# Altium footprint library ICL_komponenty_v1.PcbLib: 160 footprints (part 5 of 10)
Each footprint in its own frame and in the unit in brackets; x right, y up, seen from the top. Pads: shape width x height; smd on the part's side, far side on the other; paste and mask are expansions set on the pad; w line width, h text height; cw(c..) or ccw(c..) is an arc to the next point about the centre after c.
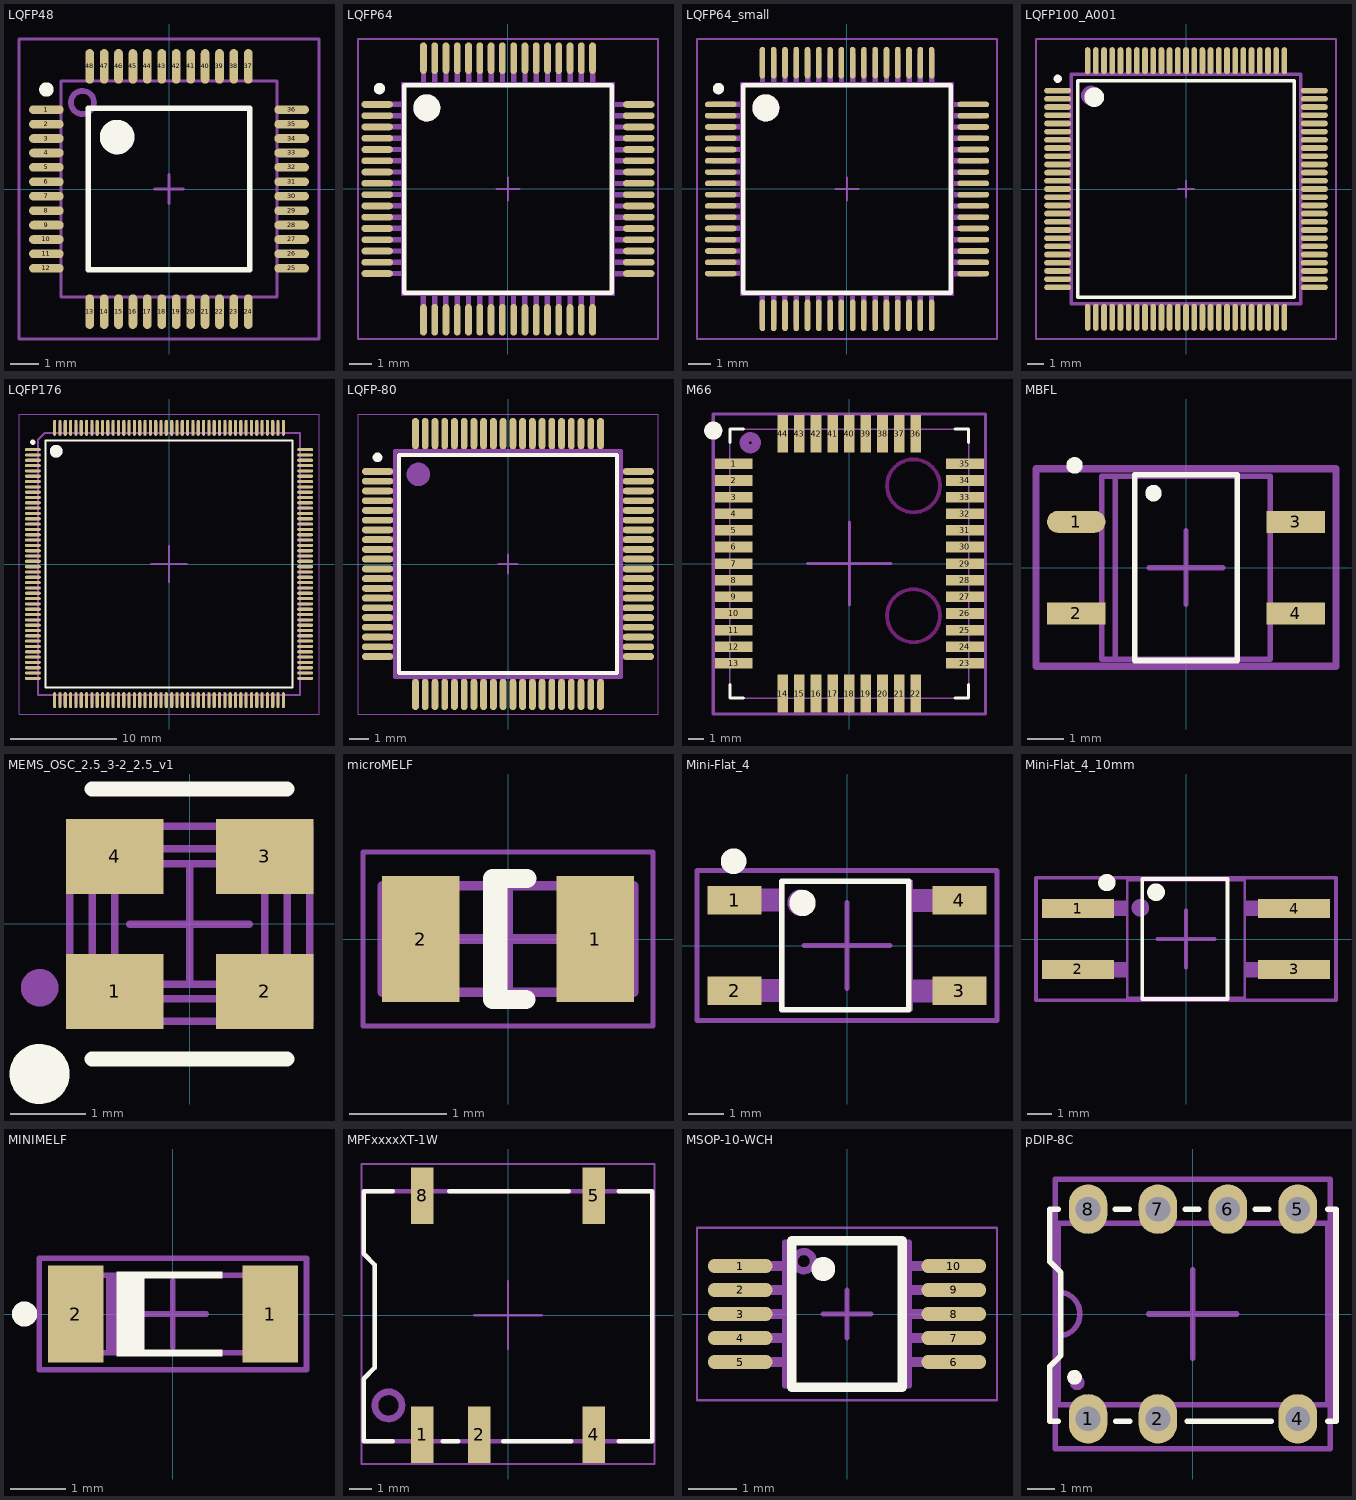
[diagram p4: the footprints below, top view; thin cyan lines are the x and y axes]

## LQFP48 [mm]
height 1.6
pads (48):
  oval 1.2x0.3 smd: 1(-4.25,2.75) 2(-4.25,2.25) 3(-4.25,1.75) 4(-4.25,1.25) 5(-4.25,0.75) 6(-4.25,0.25) 7(-4.25,-0.25) 8(-4.25,-0.75) 9(-4.25,-1.25) 10(-4.25,-1.75) 11(-4.25,-2.25) 12(-4.25,-2.75) 25(4.25,-2.75) 26(4.25,-2.25) 27(4.25,-1.75) 28(4.25,-1.25) 29(4.25,-0.75) 30(4.25,-0.25) 31(4.25,0.25) 32(4.25,0.75) 33(4.25,1.25) 34(4.25,1.75) 35(4.25,2.25) 36(4.25,2.75)
  oval 0.3x1.2 smd: 13(-2.75,-4.25) 14(-2.25,-4.25) 15(-1.75,-4.25) 16(-1.25,-4.25) 17(-0.75,-4.25) 18(-0.25,-4.25) 19(0.25,-4.25) 20(0.75,-4.25) 21(1.25,-4.25) 22(1.75,-4.25) 23(2.25,-4.25) 24(2.75,-4.25) 37(2.75,4.25) 38(2.25,4.25) 39(1.75,4.25) 40(1.25,4.25) 41(0.75,4.25) 42(0.25,4.25) 43(-0.25,4.25) 44(-0.75,4.25) 45(-1.25,4.25) 46(-1.75,4.25) 47(-2.25,4.25) 48(-2.75,4.25)
Top Overlay:
  circle w0.25: c-4.25,3.45 r0.125
  circle w0.6: c-1.8,1.8 r0.3
  lines w0.2: -2.8,-2.8 -2.8,2.8 2.8,2.8 2.8,-2.8 -2.8,-2.8
Top M11-12_SMOT:
  circle w0.2: c-3,3 r0.4
  rectangle: -2.85,3.75 -2.65,4.6
  rectangle: -2.35,3.75 -2.15,4.6
  rectangle: -1.85,3.75 -1.65,4.6
  rectangle: -1.35,3.75 -1.15,4.6
  rectangle: -0.85,3.75 -0.65,4.6
  rectangle: -0.35,3.75 -0.15,4.6
  rectangle: 0.15,3.75 0.35,4.6
  rectangle: 0.65,3.75 0.85,4.6
  rectangle: 1.15,3.75 1.35,4.6
  rectangle: 1.65,3.75 1.85,4.6
  rectangle: 2.15,3.75 2.35,4.6
  rectangle: 2.65,3.75 2.85,4.6
  region: 3.75,2.85 3.75,2.65 4.6,2.65 4.6,2.85
  region: 3.75,2.35 3.75,2.15 4.6,2.15 4.6,2.35
  region: 3.75,1.85 3.75,1.65 4.6,1.65 4.6,1.85
  region: 3.75,1.35 3.75,1.15 4.6,1.15 4.6,1.35
  region: 3.75,0.85 3.75,0.65 4.6,0.65 4.6,0.85
  region: 3.75,0.35 3.75,0.15 4.6,0.15 4.6,0.35
  region: 3.75,-0.15 3.75,-0.35 4.6,-0.35 4.6,-0.15
  region: 3.75,-0.65 3.75,-0.85 4.6,-0.85 4.6,-0.65
  region: 3.75,-1.15 3.75,-1.35 4.6,-1.35 4.6,-1.15
  region: 3.75,-1.65 3.75,-1.85 4.6,-1.85 4.6,-1.65
  region: 3.75,-2.15 3.75,-2.35 4.6,-2.35 4.6,-2.15
  region: 3.75,-2.65 3.75,-2.85 4.6,-2.85 4.6,-2.65
  region: 2.85,-3.75 2.65,-3.75 2.65,-4.6 2.85,-4.6
  region: 2.35,-3.75 2.15,-3.75 2.15,-4.6 2.35,-4.6
  region: 1.85,-3.75 1.65,-3.75 1.65,-4.6 1.85,-4.6
  region: 1.35,-3.75 1.15,-3.75 1.15,-4.6 1.35,-4.6
  region: 0.85,-3.75 0.65,-3.75 0.65,-4.6 0.85,-4.6
  region: 0.35,-3.75 0.15,-3.75 0.15,-4.6 0.35,-4.6
  region: -0.15,-3.75 -0.35,-3.75 -0.35,-4.6 -0.15,-4.6
  region: -0.65,-3.75 -0.85,-3.75 -0.85,-4.6 -0.65,-4.6
  region: -1.15,-3.75 -1.35,-3.75 -1.35,-4.6 -1.15,-4.6
  region: -1.65,-3.75 -1.85,-3.75 -1.85,-4.6 -1.65,-4.6
  region: -2.15,-3.75 -2.35,-3.75 -2.35,-4.6 -2.15,-4.6
  region: -2.65,-3.75 -2.85,-3.75 -2.85,-4.6 -2.65,-4.6
  region: -3.75,-2.85 -3.75,-2.65 -4.6,-2.65 -4.6,-2.85
  region: -3.75,-2.35 -3.75,-2.15 -4.6,-2.15 -4.6,-2.35
  region: -3.75,-1.85 -3.75,-1.65 -4.6,-1.65 -4.6,-1.85
  region: -3.75,-1.35 -3.75,-1.15 -4.6,-1.15 -4.6,-1.35
  region: -3.75,-0.85 -3.75,-0.65 -4.6,-0.65 -4.6,-0.85
  region: -3.75,-0.35 -3.75,-0.15 -4.6,-0.15 -4.6,-0.35
  region: -3.75,0.15 -3.75,0.35 -4.6,0.35 -4.6,0.15
  region: -3.75,0.65 -3.75,0.85 -4.6,0.85 -4.6,0.65
  region: -3.75,1.15 -3.75,1.35 -4.6,1.35 -4.6,1.15
  region: -3.75,1.65 -3.75,1.85 -4.6,1.85 -4.6,1.65
  region: -3.75,2.15 -3.75,2.35 -4.6,2.35 -4.6,2.15
  region: -3.75,2.65 -3.75,2.85 -4.6,2.85 -4.6,2.65
  lines w0.1: -3.75,-3.75 -3.75,3.75 3.75,3.75 3.75,-3.75 -3.75,-3.75
Top M13-14_SDES:
  text "'.Designator'" at -6.798,-0.5 h1.2
Top M15-16_SORG:
  lines w0.1: -0.5,0 0.5,0 ; 0,-0.5 0,0.5 ; -5.2,-5.2 -5.2,5.2 5.2,5.2 5.2,-5.2 -5.2,-5.2
3D body "LQFP-48.stp": height 1.56, standoff 0, extent -4.5,-4.529 4.5,4.47

## LQFP64 [mm] "TSQFP, 64-Leads, Body 10,00x10,00mm, Pitch 0,50mm"
height 1.6
pads (64):
  oval 1.4x0.3 smd: 1(-5.8,3.75) 2(-5.8,3.25) 3(-5.8,2.75) 4(-5.8,2.25) 5(-5.8,1.75) 6(-5.8,1.25) 7(-5.8,0.75) 8(-5.8,0.25) 9(-5.8,-0.25) 10(-5.8,-0.75) 11(-5.8,-1.25) 12(-5.8,-1.75) 13(-5.8,-2.25) 14(-5.8,-2.75) 15(-5.8,-3.25) 16(-5.8,-3.75) 33(5.8,-3.75) 34(5.8,-3.25) 35(5.8,-2.75) 36(5.8,-2.25) 37(5.8,-1.75) 38(5.8,-1.25) 39(5.8,-0.75) 40(5.8,-0.25) 41(5.8,0.25) 42(5.8,0.75) 43(5.8,1.25) 44(5.8,1.75) 45(5.8,2.25) 46(5.8,2.75) 47(5.8,3.25) 48(5.8,3.75)
  oval 0.3x1.4 smd: 17(-3.75,-5.8) 18(-3.25,-5.8) 19(-2.75,-5.8) 20(-2.25,-5.8) 21(-1.75,-5.8) 22(-1.25,-5.8) 23(-0.75,-5.8) 24(-0.25,-5.8) 25(0.25,-5.8) 26(0.75,-5.8) 27(1.25,-5.8) 28(1.75,-5.8) 29(2.25,-5.8) 30(2.75,-5.8) 31(3.25,-5.8) 32(3.75,-5.8) 49(3.75,5.8) 50(3.25,5.8) 51(2.75,5.8) 52(2.25,5.8) 53(1.75,5.8) 54(1.25,5.8) 55(0.75,5.8) 56(0.25,5.8) 57(-0.25,5.8) 58(-0.75,5.8) 59(-1.25,5.8) 60(-1.75,5.8) 61(-2.25,5.8) 62(-2.75,5.8) 63(-3.25,5.8) 64(-3.75,5.8)
Top Overlay:
  circle w0.25: c-5.7,4.45 r0.125
  circle w0.6: c-3.6,3.6 r0.3
  lines w0.2: -4.6,-4.6 -4.6,4.6 4.6,4.6 4.6,-4.6 -4.6,-4.6
Top M11-12_SMOT:
  circle w0.25: c-5.7,4.45 r0.125
  circle w0.6: c-3.6,3.6 r0.3
  region: -4.707,-2.366 -4.707,-2.128 -6.006,-2.128 -6.006,-2.366
  region: -4.707,-2.866 -4.707,-2.628 -6.006,-2.628 -6.006,-2.866
  region: -4.707,-3.366 -4.707,-3.128 -6.006,-3.128 -6.006,-3.366
  region: -4.707,-3.866 -4.707,-3.628 -6.006,-3.628 -6.006,-3.866
  region: -4.707,-0.366 -4.707,-0.128 -6.006,-0.128 -6.006,-0.366
  region: -4.707,-0.866 -4.707,-0.628 -6.006,-0.628 -6.006,-0.866
  region: -4.707,-1.366 -4.707,-1.128 -6.006,-1.128 -6.006,-1.366
  region: -4.707,-1.866 -4.707,-1.628 -6.006,-1.628 -6.006,-1.866
  region: -4.707,1.634 -4.707,1.872 -6.006,1.872 -6.006,1.634
  region: -4.707,1.134 -4.707,1.372 -6.006,1.372 -6.006,1.134
  region: -4.707,0.634 -4.707,0.872 -6.006,0.872 -6.006,0.634
  region: -4.707,0.134 -4.707,0.372 -6.006,0.372 -6.006,0.134
  region: -4.707,3.634 -4.707,3.872 -6.006,3.872 -6.006,3.634
  region: -4.707,3.134 -4.707,3.372 -6.006,3.372 -6.006,3.134
  region: -4.707,2.634 -4.707,2.872 -6.006,2.872 -6.006,2.634
  region: -4.707,2.134 -4.707,2.372 -6.006,2.372 -6.006,2.134
  region: -3.634,-4.707 -3.872,-4.707 -3.872,-6.006 -3.634,-6.006
  region: -3.134,-4.707 -3.372,-4.707 -3.372,-6.006 -3.134,-6.006
  region: -2.634,-4.707 -2.872,-4.707 -2.872,-6.006 -2.634,-6.006
  region: -2.134,-4.707 -2.372,-4.707 -2.372,-6.006 -2.134,-6.006
  rectangle: -2.366,4.707 -2.128,6.006
  rectangle: -2.866,4.707 -2.628,6.006
  rectangle: -3.366,4.707 -3.128,6.006
  rectangle: -3.866,4.707 -3.628,6.006
  region: -1.634,-4.707 -1.872,-4.707 -1.872,-6.006 -1.634,-6.006
  region: -1.134,-4.707 -1.372,-4.707 -1.372,-6.006 -1.134,-6.006
  region: -0.634,-4.707 -0.872,-4.707 -0.872,-6.006 -0.634,-6.006
  region: -0.134,-4.707 -0.372,-4.707 -0.372,-6.006 -0.134,-6.006
  rectangle: -0.366,4.707 -0.128,6.006
  rectangle: -0.866,4.707 -0.628,6.006
  rectangle: -1.366,4.707 -1.128,6.006
  rectangle: -1.866,4.707 -1.628,6.006
  region: 0.366,-4.707 0.128,-4.707 0.128,-6.006 0.366,-6.006
  region: 0.866,-4.707 0.628,-4.707 0.628,-6.006 0.866,-6.006
  region: 1.366,-4.707 1.128,-4.707 1.128,-6.006 1.366,-6.006
  region: 1.866,-4.707 1.628,-4.707 1.628,-6.006 1.866,-6.006
  rectangle: 1.634,4.707 1.872,6.006
  rectangle: 1.134,4.707 1.372,6.006
  rectangle: 0.634,4.707 0.872,6.006
  rectangle: 0.134,4.707 0.372,6.006
  region: 2.366,-4.707 2.128,-4.707 2.128,-6.006 2.366,-6.006
  region: 2.866,-4.707 2.628,-4.707 2.628,-6.006 2.866,-6.006
  region: 3.366,-4.707 3.128,-4.707 3.128,-6.006 3.366,-6.006
  region: 3.866,-4.707 3.628,-4.707 3.628,-6.006 3.866,-6.006
  rectangle: 3.634,4.707 3.872,6.006
  rectangle: 3.134,4.707 3.372,6.006
  rectangle: 2.634,4.707 2.872,6.006
  rectangle: 2.134,4.707 2.372,6.006
  region: 4.707,-3.634 4.707,-3.872 6.006,-3.872 6.006,-3.634
  region: 4.707,-3.134 4.707,-3.372 6.006,-3.372 6.006,-3.134
  region: 4.707,-2.634 4.707,-2.872 6.006,-2.872 6.006,-2.634
  region: 4.707,-2.134 4.707,-2.372 6.006,-2.372 6.006,-2.134
  region: 4.707,-1.634 4.707,-1.872 6.006,-1.872 6.006,-1.634
  region: 4.707,-1.134 4.707,-1.372 6.006,-1.372 6.006,-1.134
  region: 4.707,-0.634 4.707,-0.872 6.006,-0.872 6.006,-0.634
  region: 4.707,-0.134 4.707,-0.372 6.006,-0.372 6.006,-0.134
  region: 4.707,0.366 4.707,0.128 6.006,0.128 6.006,0.366
  region: 4.707,0.866 4.707,0.628 6.006,0.628 6.006,0.866
  region: 4.707,1.366 4.707,1.128 6.006,1.128 6.006,1.366
  region: 4.707,1.866 4.707,1.628 6.006,1.628 6.006,1.866
  region: 4.707,2.366 4.707,2.128 6.006,2.128 6.006,2.366
  region: 4.707,2.866 4.707,2.628 6.006,2.628 6.006,2.866
  region: 4.707,3.366 4.707,3.128 6.006,3.128 6.006,3.366
  region: 4.707,3.866 4.707,3.628 6.006,3.628 6.006,3.866
  lines w0.1: -4.7,-4.7 -4.7,4.7 4.7,4.7 4.7,-4.7 -4.7,-4.7
Top M13-14_SDES:
  text "'.Designator'" at -6.798,-0.5 h1.2
Top M15-16_SORG:
  lines w0.1: -0.5,0 0.5,0 ; 0,-0.5 0,0.5 ; -6.65,-6.65 -6.65,6.65 6.65,6.65 6.65,-6.65 -6.65,-6.65
3D body "LQFP64.step": height 1.6, standoff 0, extent -6,-6 6,6

## LQFP64_small [mm] "TSQFP, 64-Leads, Body 10,00x10,00mm, Pitch 0,50mm"
height 1.6
pads (64):
  oval 1.4x0.25 smd: 1(-5.6,3.75) 2(-5.6,3.25) 3(-5.6,2.75) 4(-5.6,2.25) 5(-5.6,1.75) 6(-5.6,1.25) 7(-5.6,0.75) 8(-5.6,0.25) 9(-5.6,-0.25) 10(-5.6,-0.75) 11(-5.6,-1.25) 12(-5.6,-1.75) 13(-5.6,-2.25) 14(-5.6,-2.75) 15(-5.6,-3.25) 16(-5.6,-3.75) 33(5.6,-3.75) 34(5.6,-3.25) 35(5.6,-2.75) 36(5.6,-2.25) 37(5.6,-1.75) 38(5.6,-1.25) 39(5.6,-0.75) 40(5.6,-0.25) 41(5.6,0.25) 42(5.6,0.75) 43(5.6,1.25) 44(5.6,1.75) 45(5.6,2.25) 46(5.6,2.75) 47(5.6,3.25) 48(5.6,3.75)
  oval 0.25x1.4 smd: 17(-3.75,-5.6) 18(-3.25,-5.6) 19(-2.75,-5.6) 20(-2.25,-5.6) 21(-1.75,-5.6) 22(-1.25,-5.6) 23(-0.75,-5.6) 24(-0.25,-5.6) 25(0.25,-5.6) 26(0.75,-5.6) 27(1.25,-5.6) 28(1.75,-5.6) 29(2.25,-5.6) 30(2.75,-5.6) 31(3.25,-5.6) 32(3.75,-5.6) 49(3.75,5.6) 50(3.25,5.6) 51(2.75,5.6) 52(2.25,5.6) 53(1.75,5.6) 54(1.25,5.6) 55(0.75,5.6) 56(0.25,5.6) 57(-0.25,5.6) 58(-0.75,5.6) 59(-1.25,5.6) 60(-1.75,5.6) 61(-2.25,5.6) 62(-2.75,5.6) 63(-3.25,5.6) 64(-3.75,5.6)
Top Overlay:
  circle w0.6: c-3.6,3.6 r0.3
  circle w0.25: c-5.7,4.45 r0.125
  lines w0.2: -4.6,-4.6 4.6,-4.6 4.6,4.6 -4.6,4.6 -4.6,-4.6
Top M11-12_SMOT:
  circle w0.6: c-3.6,3.6 r0.3
  circle w0.25: c-5.7,4.45 r0.125
  region: 4.707,3.866 4.707,3.628 6.006,3.628 6.006,3.866
  region: 4.707,3.366 4.707,3.128 6.006,3.128 6.006,3.366
  region: 4.707,2.866 4.707,2.628 6.006,2.628 6.006,2.866
  region: 4.707,2.366 4.707,2.128 6.006,2.128 6.006,2.366
  region: 4.707,1.866 4.707,1.628 6.006,1.628 6.006,1.866
  region: 4.707,1.366 4.707,1.128 6.006,1.128 6.006,1.366
  region: 4.707,0.866 4.707,0.628 6.006,0.628 6.006,0.866
  region: 4.707,0.366 4.707,0.128 6.006,0.128 6.006,0.366
  region: 4.707,-0.134 4.707,-0.372 6.006,-0.372 6.006,-0.134
  region: 4.707,-0.634 4.707,-0.872 6.006,-0.872 6.006,-0.634
  region: 4.707,-1.134 4.707,-1.372 6.006,-1.372 6.006,-1.134
  region: 4.707,-1.634 4.707,-1.872 6.006,-1.872 6.006,-1.634
  region: 4.707,-2.134 4.707,-2.372 6.006,-2.372 6.006,-2.134
  region: 4.707,-2.634 4.707,-2.872 6.006,-2.872 6.006,-2.634
  region: 4.707,-3.134 4.707,-3.372 6.006,-3.372 6.006,-3.134
  region: 4.707,-3.634 4.707,-3.872 6.006,-3.872 6.006,-3.634
  rectangle: 2.134,4.707 2.372,6.006
  rectangle: 2.634,4.707 2.872,6.006
  rectangle: 3.134,4.707 3.372,6.006
  rectangle: 3.634,4.707 3.872,6.006
  region: 3.866,-4.707 3.628,-4.707 3.628,-6.006 3.866,-6.006
  region: 3.366,-4.707 3.128,-4.707 3.128,-6.006 3.366,-6.006
  region: 2.866,-4.707 2.628,-4.707 2.628,-6.006 2.866,-6.006
  region: 2.366,-4.707 2.128,-4.707 2.128,-6.006 2.366,-6.006
  rectangle: 0.134,4.707 0.372,6.006
  rectangle: 0.634,4.707 0.872,6.006
  rectangle: 1.134,4.707 1.372,6.006
  rectangle: 1.634,4.707 1.872,6.006
  region: 1.866,-4.707 1.628,-4.707 1.628,-6.006 1.866,-6.006
  region: 1.366,-4.707 1.128,-4.707 1.128,-6.006 1.366,-6.006
  region: 0.866,-4.707 0.628,-4.707 0.628,-6.006 0.866,-6.006
  region: 0.366,-4.707 0.128,-4.707 0.128,-6.006 0.366,-6.006
  rectangle: -1.866,4.707 -1.628,6.006
  rectangle: -1.366,4.707 -1.128,6.006
  rectangle: -0.866,4.707 -0.628,6.006
  rectangle: -0.366,4.707 -0.128,6.006
  region: -0.134,-4.707 -0.372,-4.707 -0.372,-6.006 -0.134,-6.006
  region: -0.634,-4.707 -0.872,-4.707 -0.872,-6.006 -0.634,-6.006
  region: -1.134,-4.707 -1.372,-4.707 -1.372,-6.006 -1.134,-6.006
  region: -1.634,-4.707 -1.872,-4.707 -1.872,-6.006 -1.634,-6.006
  rectangle: -3.866,4.707 -3.628,6.006
  rectangle: -3.366,4.707 -3.128,6.006
  rectangle: -2.866,4.707 -2.628,6.006
  rectangle: -2.366,4.707 -2.128,6.006
  region: -2.134,-4.707 -2.372,-4.707 -2.372,-6.006 -2.134,-6.006
  region: -2.634,-4.707 -2.872,-4.707 -2.872,-6.006 -2.634,-6.006
  region: -3.134,-4.707 -3.372,-4.707 -3.372,-6.006 -3.134,-6.006
  region: -3.634,-4.707 -3.872,-4.707 -3.872,-6.006 -3.634,-6.006
  region: -4.707,2.134 -4.707,2.372 -6.006,2.372 -6.006,2.134
  region: -4.707,2.634 -4.707,2.872 -6.006,2.872 -6.006,2.634
  region: -4.707,3.134 -4.707,3.372 -6.006,3.372 -6.006,3.134
  region: -4.707,3.634 -4.707,3.872 -6.006,3.872 -6.006,3.634
  region: -4.707,0.134 -4.707,0.372 -6.006,0.372 -6.006,0.134
  region: -4.707,0.634 -4.707,0.872 -6.006,0.872 -6.006,0.634
  region: -4.707,1.134 -4.707,1.372 -6.006,1.372 -6.006,1.134
  region: -4.707,1.634 -4.707,1.872 -6.006,1.872 -6.006,1.634
  region: -4.707,-1.866 -4.707,-1.628 -6.006,-1.628 -6.006,-1.866
  region: -4.707,-1.366 -4.707,-1.128 -6.006,-1.128 -6.006,-1.366
  region: -4.707,-0.866 -4.707,-0.628 -6.006,-0.628 -6.006,-0.866
  region: -4.707,-0.366 -4.707,-0.128 -6.006,-0.128 -6.006,-0.366
  region: -4.707,-3.866 -4.707,-3.628 -6.006,-3.628 -6.006,-3.866
  region: -4.707,-3.366 -4.707,-3.128 -6.006,-3.128 -6.006,-3.366
  region: -4.707,-2.866 -4.707,-2.628 -6.006,-2.628 -6.006,-2.866
  region: -4.707,-2.366 -4.707,-2.128 -6.006,-2.128 -6.006,-2.366
  lines w0.1: -4.7,-4.7 4.7,-4.7 4.7,4.7 -4.7,4.7 -4.7,-4.7
Top M13-14_SDES:
  text "'.Designator'" at -6.798,-0.5 h1.2
Top M15-16_SORG:
  lines w0.1: -0.5,0 0.5,0 ; 0,-0.5 0,0.5 ; -6.65,-6.65 6.65,-6.65 6.65,6.65 -6.65,6.65 -6.65,-6.65
3D body "LQFP64.step": height 1.6, standoff 0, extent -6,-6 6,6

## LQFP100_A001 [mm] "TSQFP, 100-Leads, Body 14,00x14,00mm, Pitch 0,50mm, IPC Low Density"
height 1.6
pads (100):
  oval 1.65x0.35 smd: 1(-7.825,6) 2(-7.825,5.5) 3(-7.825,5) 4(-7.825,4.5) 5(-7.825,4) 6(-7.825,3.5) 7(-7.825,3) 8(-7.825,2.5) 9(-7.825,2) 10(-7.825,1.5) 11(-7.825,1) 12(-7.825,0.5) 13(-7.825,0) 14(-7.825,-0.5) 15(-7.825,-1) 16(-7.825,-1.5) 17(-7.825,-2) 18(-7.825,-2.5) 19(-7.825,-3) 20(-7.825,-3.5) 21(-7.825,-4) 22(-7.825,-4.5) 23(-7.825,-5) 24(-7.825,-5.5) 25(-7.825,-6) 51(7.825,-6) 52(7.825,-5.5) 53(7.825,-5) 54(7.825,-4.5) 55(7.825,-4) 56(7.825,-3.5) 57(7.825,-3) 58(7.825,-2.5) 59(7.825,-2) 60(7.825,-1.5) 61(7.825,-1) 62(7.825,-0.5) 63(7.825,0) 64(7.825,0.5) 65(7.825,1) 66(7.825,1.5) 67(7.825,2) 68(7.825,2.5) 69(7.825,3) 70(7.825,3.5) 71(7.825,4) 72(7.825,4.5) 73(7.825,5) 74(7.825,5.5) 75(7.825,6)
  oval 0.35x1.65 smd: 26(-6,-7.825) 27(-5.5,-7.825) 28(-5,-7.825) 29(-4.5,-7.825) 30(-4,-7.825) 31(-3.5,-7.825) 32(-3,-7.825) 33(-2.5,-7.825) 34(-2,-7.825) 35(-1.5,-7.825) 36(-1,-7.825) 37(-0.5,-7.825) 38(0,-7.825) 39(0.5,-7.825) 40(1,-7.825) 41(1.5,-7.825) 42(2,-7.825) 43(2.5,-7.825) 44(3,-7.825) 45(3.5,-7.825) 46(4,-7.825) 47(4.5,-7.825) 48(5,-7.825) 49(5.5,-7.825) 50(6,-7.825) 76(6,7.825) 77(5.5,7.825) 78(5,7.825) 79(4.5,7.825) 80(4,7.825) 81(3.5,7.825) 82(3,7.825) 83(2.5,7.825) 84(2,7.825) 85(1.5,7.825) 86(1,7.825) 87(0.5,7.825) 88(0,7.825) 89(-0.5,7.825) 90(-1,7.825) 91(-1.5,7.825) 92(-2,7.825) 93(-2.5,7.825) 94(-3,7.825) 95(-3.5,7.825) 96(-4,7.825) 97(-4.5,7.825) 98(-5,7.825) 99(-5.5,7.825) 100(-6,7.825)
Top Overlay:
  circle w0.6: c-5.6,5.6 r0.3
  circle w0.25: c-7.825,6.725 r0.125
  lines w0.2: -6.6,-6.6 6.6,-6.6 6.6,6.6 -6.6,6.6 -6.6,-6.6
Top M11-12_SMOT:
  circle w0.6: c-5.8,5.7 r0.3
  rectangle: -6.1,7 -5.9,8
  rectangle: -5.6,7 -5.4,8
  rectangle: -5.1,7 -4.9,8
  rectangle: -4.6,7 -4.4,8
  rectangle: -4.1,7 -3.9,8
  rectangle: -3.6,7 -3.4,8
  rectangle: -3.1,7 -2.9,8
  rectangle: -2.6,7 -2.4,8
  rectangle: -2.1,7 -1.9,8
  rectangle: -1.6,7 -1.4,8
  rectangle: -1.1,7 -0.9,8
  rectangle: -0.6,7 -0.4,8
  rectangle: -0.1,7 0.1,8
  rectangle: 0.4,7 0.6,8
  rectangle: 0.9,7 1.1,8
  rectangle: 1.4,7 1.6,8
  rectangle: 1.9,7 2.1,8
  rectangle: 2.4,7 2.6,8
  rectangle: 2.9,7 3.1,8
  rectangle: 3.4,7 3.6,8
  rectangle: 3.9,7 4.1,8
  rectangle: 4.4,7 4.6,8
  rectangle: 4.9,7 5.1,8
  rectangle: 5.4,7 5.6,8
  rectangle: 5.9,7 6.1,8
  region: 7,6.1 7,5.9 8,5.9 8,6.1
  region: 7,5.6 7,5.4 8,5.4 8,5.6
  region: 7,5.1 7,4.9 8,4.9 8,5.1
  region: 7,4.6 7,4.4 8,4.4 8,4.6
  region: 7,4.1 7,3.9 8,3.9 8,4.1
  region: 7,3.6 7,3.4 8,3.4 8,3.6
  region: 7,3.1 7,2.9 8,2.9 8,3.1
  region: 7,2.6 7,2.4 8,2.4 8,2.6
  region: 7,2.1 7,1.9 8,1.9 8,2.1
  region: 7,1.6 7,1.4 8,1.4 8,1.6
  region: 7,1.1 7,0.9 8,0.9 8,1.1
  region: 7,0.6 7,0.4 8,0.4 8,0.6
  region: 7,0.1 7,-0.1 8,-0.1 8,0.1
  region: 7,-0.4 7,-0.6 8,-0.6 8,-0.4
  region: 7,-0.9 7,-1.1 8,-1.1 8,-0.9
  region: 7,-1.4 7,-1.6 8,-1.6 8,-1.4
  region: 7,-1.9 7,-2.1 8,-2.1 8,-1.9
  region: 7,-2.4 7,-2.6 8,-2.6 8,-2.4
  region: 7,-2.9 7,-3.1 8,-3.1 8,-2.9
  region: 7,-3.4 7,-3.6 8,-3.6 8,-3.4
  region: 7,-3.9 7,-4.1 8,-4.1 8,-3.9
  region: 7,-4.4 7,-4.6 8,-4.6 8,-4.4
  region: 7,-4.9 7,-5.1 8,-5.1 8,-4.9
  region: 7,-5.4 7,-5.6 8,-5.6 8,-5.4
  region: 7,-5.9 7,-6.1 8,-6.1 8,-5.9
  region: 6.1,-7 5.9,-7 5.9,-8 6.1,-8
  region: 5.6,-7 5.4,-7 5.4,-8 5.6,-8
  region: 5.1,-7 4.9,-7 4.9,-8 5.1,-8
  region: 4.6,-7 4.4,-7 4.4,-8 4.6,-8
  region: 4.1,-7 3.9,-7 3.9,-8 4.1,-8
  region: 3.6,-7 3.4,-7 3.4,-8 3.6,-8
  region: 3.1,-7 2.9,-7 2.9,-8 3.1,-8
  region: 2.6,-7 2.4,-7 2.4,-8 2.6,-8
  region: 2.1,-7 1.9,-7 1.9,-8 2.1,-8
  region: 1.6,-7 1.4,-7 1.4,-8 1.6,-8
  region: 1.1,-7 0.9,-7 0.9,-8 1.1,-8
  region: 0.6,-7 0.4,-7 0.4,-8 0.6,-8
  region: 0.1,-7 -0.1,-7 -0.1,-8 0.1,-8